# Altium footprint library MIcrocontrollers.PcbLib: 4 footprints
Each footprint in its own frame and in the unit in brackets; x right, y up, seen from the top. Pads: shape width x height; smd on the part's side, far side on the other; paste and mask are expansions set on the pad; w line width, h text height; cw(c..) or ccw(c..) is an arc to the next point about the centre after c.
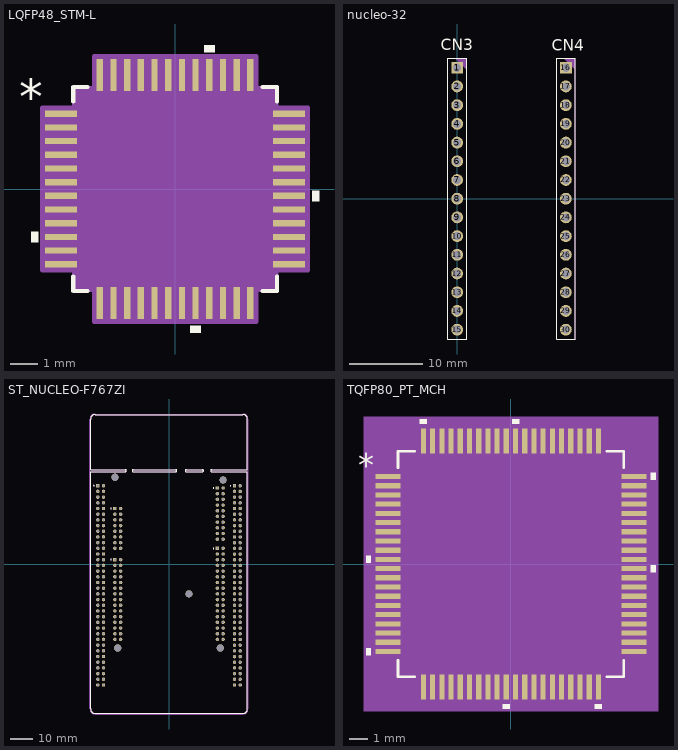
[diagram p0: the footprints below, top view; thin cyan lines are the x and y axes]

## LQFP48_STM-L [mil]
pads (48):
  rect 46x9 smd paste+0 mask+0: 1(-164,108.27) 2(-164,88.58) 3(-164,68.9) 4(-164,49.21) 5(-164,29.53) 6(-164,9.84) 7(-164,-9.84) 8(-164,-29.53) 9(-164,-49.21) 10(-164,-68.9) 11(-164,-88.58) 12(-164,-108.27) 25(164,-108.27) 26(164,-88.58) 27(164,-68.9) 28(164,-49.21) 29(164,-29.53) 30(164,-9.84) 31(164,9.84) 32(164,29.53) 33(164,49.21) 34(164,68.9) 35(164,88.58) 36(164,108.27)
  rect 9x46 smd paste+0 mask+0: 13(-108.27,-164) 14(-88.58,-164) 15(-68.9,-164) 16(-49.21,-164) 17(-29.53,-164) 18(-9.84,-164) 19(9.84,-164) 20(29.53,-164) 21(49.21,-164) 22(68.9,-164) 23(88.58,-164) 24(108.27,-164) 37(108.27,164) 38(88.58,164) 39(68.9,164) 40(49.21,164) 41(29.53,164) 42(9.84,164) 43(-9.84,164) 44(-29.53,164) 45(-49.21,164) 46(-68.9,164) 47(-88.58,164) 48(-108.27,164)
Top Overlay:
  region: 56.71,197 41.71,197 41.71,207 56.71,207
  region: 197,-2.34 207,-2.34 207,-17.34 197,-17.34
  region: 37.03,-197 22.03,-197 22.03,-207 37.03,-207
  region: -197,-61.4 -207,-61.4 -207,-76.4 -197,-76.4
  lines w6: -146.5,-125.87 -146.5,-146.5 -125.87,-146.5 ; -146.5,125.87 -146.5,146.5 -125.87,146.5 ; 125.87,-146.5 146.5,-146.5 146.5,-125.87 ; 125.87,146.5 146.5,146.5 146.5,125.87
  text "*" at -224.5,108.11 h50
Mechanical 13:
  drawing of 197 lines, arcs and shapes, not listed
  text "*" at -139,93.11 h50
Mechanical 15:
  region: -115.77,-145.5 -144.5,-145.5 -144.5,-116.77 -190,-116.77 -190,116.77 -144.5,116.77 -144.5,145.5 -115.77,145.5 -115.77,191 117.77,191 117.77,145.5 146.5,145.5 146.5,116.77 192,116.77 192,-116.77 146.5,-116.77 146.5,-145.5 117.77,-145.5 117.77,-191 -115.77,-191
  lines w6: -191,-116.77 -191,116.77 -145.5,116.77 -145.5,145.5 -116.77,145.5 -116.77,191 116.77,191 116.77,145.5 145.5,145.5 145.5,116.77 191,116.77 191,-116.77 145.5,-116.77 145.5,-145.5 116.77,-145.5 116.77,-191 -116.77,-191 -116.77,-145.5 -145.5,-145.5 -145.5,-116.77 -191,-116.77
3D body "LQFP48_STM.step": height 63.11, standoff 0, extent -180.98,-180.98 180.98,180.98

## nucleo-32 [mm]
pads (30):
  rect 1.6x1.6 hole 1.1: 1(0,17.78) 16(14.76,17.78)
  round 1.6 hole 1.1: 2(0,15.24) 3(0,12.7) 4(0,10.16) 5(0,7.62) 6(0,5.08) 7(0,2.54) 8(0,0) 9(0,-2.54) 10(0,-5.08) 11(0,-7.62) 12(0,-10.16) 13(0,-12.7) 14(0,-15.24) 15(0,-17.78) 17(14.76,15.24) 18(14.76,12.7) 19(14.76,10.16) 20(14.76,7.62) 21(14.76,5.08) 22(14.76,2.54) 23(14.76,0) 24(14.76,-2.54) 25(14.76,-5.08) 26(14.76,-7.62) 27(14.76,-10.16) 28(14.76,-12.7) 29(14.76,-15.24) 30(14.76,-17.78)
Top Overlay:
  lines w0.15: -1.27,-19.05 1.27,-19.05 1.27,19.05 -1.27,19.05 -1.27,-19.05 ; 13.49,-19.05 16.03,-19.05 16.03,19.05 13.49,19.05 13.49,-19.05
  text "CN4" at 12.866,20.115 h1.52
  text "CN3" at -2.224,20.158 h1.52
Mechanical 29:
  region: 16.03,19.05 16.03,17.526 14.506,19.05
  region: 1.27,19.05 1.27,17.526 -0.254,19.05
  lines w0.15: -1.27,-19.05 -1.27,19.05 1.27,19.05 1.27,-19.05 -1.27,-19.05 ; 13.49,-19.05 13.49,19.05 16.03,19.05 16.03,-19.05 13.49,-19.05
3D body "PLS-1.STEP": height 8.5, standoff -3, extent 13.49,-19.05 16.03,-16.51
3D body "PLS-1.STEP": height 8.5, standoff -3, extent 13.49,-16.51 16.03,-13.97
3D body "PLS-1.STEP": height 8.5, standoff -3, extent 13.49,-13.97 16.03,-11.43
3D body "PLS-1.STEP": height 8.5, standoff -3, extent 13.49,-11.43 16.03,-8.89
3D body "PLS-1.STEP": height 8.5, standoff -3, extent 13.49,-8.89 16.03,-6.35
3D body "PLS-1.STEP": height 8.5, standoff -3, extent 13.49,-6.35 16.03,-3.81
3D body "PLS-1.STEP": height 8.5, standoff -3, extent 13.49,-3.81 16.03,-1.27
3D body "PLS-1.STEP": height 8.5, standoff -3, extent 13.49,-1.27 16.03,1.27
3D body "PLS-1.STEP": height 8.5, standoff -3, extent 13.49,1.27 16.03,3.81
3D body "PLS-1.STEP": height 8.5, standoff -3, extent 13.49,3.81 16.03,6.35
3D body "PLS-1.STEP": height 8.5, standoff -3, extent 13.49,6.35 16.03,8.89
3D body "PLS-1.STEP": height 8.5, standoff -3, extent 13.49,8.89 16.03,11.43
3D body "PLS-1.STEP": height 8.5, standoff -3, extent 13.49,11.43 16.03,13.97
3D body "PLS-1.STEP": height 8.5, standoff -3, extent 13.49,13.97 16.03,16.51
3D body "PLS-1.STEP": height 8.5, standoff -3, extent 13.49,16.51 16.03,19.05
3D body "PLS-1.STEP": height 8.5, standoff -3, extent -1.27,-19.05 1.27,-16.51
3D body "PLS-1.STEP": height 8.5, standoff -3, extent -1.27,-16.51 1.27,-13.97
3D body "PLS-1.STEP": height 8.5, standoff -3, extent -1.27,-13.97 1.27,-11.43
3D body "PLS-1.STEP": height 8.5, standoff -3, extent -1.27,-11.43 1.27,-8.89
3D body "PLS-1.STEP": height 8.5, standoff -3, extent -1.27,-8.89 1.27,-6.35
3D body "PLS-1.STEP": height 8.5, standoff -3, extent -1.27,-6.35 1.27,-3.81
3D body "PLS-1.STEP": height 8.5, standoff -3, extent -1.27,-3.81 1.27,-1.27
3D body "PLS-1.STEP": height 8.5, standoff -3, extent -1.27,-1.27 1.27,1.27
3D body "PLS-1.STEP": height 8.5, standoff -3, extent -1.27,1.27 1.27,3.81
3D body "PLS-1.STEP": height 8.5, standoff -3, extent -1.27,3.81 1.27,6.35
3D body "PLS-1.STEP": height 8.5, standoff -3, extent -1.27,6.35 1.27,8.89
3D body "PLS-1.STEP": height 8.5, standoff -3, extent -1.27,8.89 1.27,11.43
3D body "PLS-1.STEP": height 8.5, standoff -3, extent -1.27,11.43 1.27,13.97
3D body "PLS-1.STEP": height 8.5, standoff -3, extent -1.27,13.97 1.27,16.51
3D body "PLS-1.STEP": height 8.5, standoff -3, extent -1.27,16.51 1.27,19.05

## ST_NUCLEO-F767ZI [mm]
pads (249):
  rect 1.53x1.53 / inner round 1.53 / far side rect 1.53x1.53 hole 1.02: CN7_1(21.59,33.914) CN8_1(-24.13,24.77) CN9_1(-24.13,1.91) CN10_1(21.59,6.99) CN11_1(-31.75,34.93) CN12_1(29.21,34.91)
  round 1.53 hole 1.02: CN7_2(24.13,33.914) CN7_3(21.59,31.374) CN7_4(24.13,31.374) CN7_5(21.59,28.834) CN7_6(24.13,28.834) CN7_7(21.59,26.294) CN7_8(24.13,26.294) CN7_9(21.59,23.754) CN7_10(24.13,23.754) CN7_11(21.59,21.214) CN7_12(24.13,21.214) CN7_13(21.59,18.674) CN7_14(24.13,18.674) CN7_15(21.59,16.134) CN7_16(24.13,16.134) CN7_17(21.59,13.594) CN7_18(24.13,13.594) CN7_19(21.59,11.054) CN7_20(24.13,11.054) CN8_2(-21.59,24.77) CN8_3(-24.13,22.23) CN8_4(-21.59,22.23) CN8_5(-24.13,19.69) CN8_6(-21.59,19.69) CN8_7(-24.13,17.15) CN8_8(-21.59,17.15) CN8_9(-24.13,14.61) CN8_10(-21.59,14.61) CN8_11(-24.13,12.07) CN8_12(-21.59,12.07) CN8_13(-24.13,9.53) CN8_14(-21.59,9.53) CN8_15(-24.13,6.99) CN8_16(-21.59,6.99) CN9_2(-21.59,1.91) CN9_3(-24.13,-0.63) CN9_4(-21.59,-0.63) CN9_5(-24.13,-3.17) CN9_6(-21.59,-3.17) CN9_7(-24.13,-5.71) CN9_8(-21.59,-5.71) CN9_9(-24.13,-8.25) CN9_10(-21.59,-8.25) CN9_11(-24.13,-10.79) CN9_12(-21.59,-10.79) CN9_13(-24.13,-13.33) CN9_14(-21.59,-13.33) CN9_15(-24.13,-15.87) CN9_16(-21.59,-15.87) CN9_17(-24.13,-18.41) CN9_18(-21.59,-18.41) CN9_19(-24.13,-20.95) CN9_20(-21.59,-20.95) CN9_21(-24.13,-23.49) CN9_22(-21.59,-23.49) CN9_23(-24.13,-26.03) CN9_24(-21.59,-26.03) CN9_25(-24.13,-28.57) CN9_26(-21.59,-28.57) CN9_27(-24.13,-31.11) CN9_28(-21.59,-31.11) CN9_29(-24.13,-33.65) CN9_30(-21.59,-33.65) CN10_2(24.13,6.99) CN10_3(21.59,4.45) CN10_4(24.13,4.45) CN10_5(21.59,1.91) CN10_6(24.13,1.91) CN10_7(21.59,-0.63) CN10_8(24.13,-0.63) CN10_9(21.59,-3.17) CN10_10(24.13,-3.17) CN10_11(21.59,-5.71) CN10_12(24.13,-5.71) CN10_13(21.59,-8.25) CN10_14(24.13,-8.25) CN10_15(21.59,-10.79) CN10_16(24.13,-10.79) CN10_17(21.59,-13.33) CN10_18(24.13,-13.33) CN10_19(21.59,-15.87) CN10_20(24.13,-15.87) CN10_21(21.59,-18.41) CN10_22(24.13,-18.41) CN10_23(21.59,-20.95) CN10_24(24.13,-20.95) CN10_25(21.59,-23.49) CN10_26(24.13,-23.49) CN10_27(21.59,-26.03) CN10_28(24.13,-26.03) CN10_29(21.59,-28.57) CN10_30(24.13,-28.57) CN10_31(21.59,-31.11) CN10_32(24.13,-31.11) CN10_33(21.59,-33.65) CN10_34(24.13,-33.65) CN11_2(-29.21,34.93) CN11_3(-31.75,32.39) CN11_4(-29.21,32.39) CN11_5(-31.75,29.85) CN11_6(-29.21,29.85) CN11_7(-31.75,27.31) CN11_8(-29.21,27.31) CN11_9(-31.75,24.77) CN11_10(-29.21,24.77) CN11_11(-31.75,22.23) CN11_12(-29.21,22.23) CN11_13(-31.75,19.69) CN11_14(-29.21,19.69) CN11_15(-31.75,17.15) CN11_16(-29.21,17.15) CN11_17(-31.75,14.61) CN11_18(-29.21,14.61) CN11_19(-31.75,12.07) CN11_20(-29.21,12.07) CN11_21(-31.75,9.53) CN11_22(-29.21,9.53) CN11_23(-31.75,6.99) CN11_24(-29.21,6.99) CN11_25(-31.75,4.45) CN11_26(-29.21,4.45) CN11_27(-31.75,1.91) CN11_28(-29.21,1.91) CN11_29(-31.75,-0.63) CN11_30(-29.21,-0.63) CN11_31(-31.75,-3.17) CN11_32(-29.21,-3.17) CN11_33(-31.75,-5.71) CN11_34(-29.21,-5.71) CN11_35(-31.75,-8.25) CN11_36(-29.21,-8.25) CN11_37(-31.75,-10.79) CN11_38(-29.21,-10.79) CN11_39(-31.75,-13.33) CN11_40(-29.21,-13.33) CN11_41(-31.75,-15.87) CN11_42(-29.21,-15.87) CN11_43(-31.75,-18.41) CN11_44(-29.21,-18.41) CN11_45(-31.75,-20.95) CN11_46(-29.21,-20.95) CN11_47(-31.75,-23.49) CN11_48(-29.21,-23.49) CN11_49(-31.75,-26.03) CN11_50(-29.21,-26.03) CN11_51(-31.75,-28.57) CN11_52(-29.21,-28.57) CN11_53(-31.75,-31.11) CN11_54(-29.21,-31.11) CN11_55(-31.75,-33.65) CN11_56(-29.21,-33.65) CN11_57(-31.75,-36.19) CN11_58(-29.21,-36.19) CN11_59(-31.75,-38.73) CN11_60(-29.21,-38.73) CN11_61(-31.75,-41.27) CN11_62(-29.21,-41.27) CN11_63(-31.75,-43.81) CN11_64(-29.21,-43.81) CN11_65(-31.75,-46.35) CN11_66(-29.21,-46.35) CN11_67(-31.75,-48.89) CN11_68(-29.21,-48.89) CN11_69(-31.75,-51.43) CN11_70(-29.21,-51.43) CN11_71(-31.75,-53.97) CN11_72(-29.21,-53.97) CN12_2(31.75,34.91) CN12_3(29.21,32.37) CN12_4(31.75,32.37) CN12_5(29.21,29.83) CN12_6(31.75,29.83) CN12_7(29.21,27.29) CN12_8(31.75,27.29) CN12_9(29.21,24.75) CN12_10(31.75,24.75) CN12_11(29.21,22.21) CN12_12(31.75,22.21) CN12_13(29.21,19.67) CN12_14(31.75,19.67) CN12_15(29.21,17.13) CN12_16(31.75,17.13) CN12_17(29.21,14.59) CN12_18(31.75,14.59) CN12_19(29.21,12.05) CN12_20(31.75,12.05) CN12_21(29.21,9.51) CN12_22(31.75,9.51) CN12_23(29.21,6.97) CN12_24(31.75,6.97) CN12_25(29.21,4.43) CN12_26(31.75,4.43) CN12_27(29.21,1.89) CN12_28(31.75,1.89) CN12_29(29.21,-0.65) CN12_30(31.75,-0.65) CN12_31(29.21,-3.19) CN12_32(31.75,-3.19) CN12_33(29.21,-5.73) CN12_34(31.75,-5.73) CN12_35(29.21,-8.27) CN12_36(31.75,-8.27) CN12_37(29.21,-10.81) CN12_38(31.75,-10.81) CN12_39(29.21,-13.35) CN12_40(31.75,-13.35) CN12_41(29.21,-15.89) CN12_42(31.75,-15.89) CN12_43(29.21,-18.43) CN12_44(31.75,-18.43) CN12_45(29.21,-20.97) CN12_46(31.75,-20.97) CN12_47(29.21,-23.51) CN12_48(31.75,-23.51) CN12_49(29.21,-26.05) CN12_50(31.75,-26.05) CN12_51(29.21,-28.59) CN12_52(31.75,-28.59) CN12_53(29.21,-31.13) CN12_54(31.75,-31.13) CN12_55(29.21,-33.67) CN12_56(31.75,-33.67) CN12_57(29.21,-36.21) CN12_58(31.75,-36.21) CN12_59(29.21,-38.75) CN12_60(31.75,-38.75) CN12_61(29.21,-41.29) CN12_62(31.75,-41.29) CN12_63(29.21,-43.83) CN12_64(31.75,-43.83) CN12_65(29.21,-46.37) CN12_66(31.75,-46.37) CN12_67(29.21,-48.91) CN12_68(31.75,-48.91) CN12_69(29.21,-51.45) CN12_70(31.75,-51.45) CN12_71(29.21,-53.99) CN12_72(31.75,-53.99)
  round 3.2 hole 3.2 unplated: ""(-24.13,38.74) ""(-22.86,-37.46) ""(8.89,-13.33) ""(22.86,-37.46) ""(24.13,37.47)
Top Overlay:
  circle w0.2: c-33.5,34.93 r0.1
  circle w0.2: c27.46,34.905 r0.1
  circle w0.2: c-25.88,24.77 r0.1
  circle w0.2: c-25.88,1.91 r0.1
  circle w0.2: c19.84,33.914 r0.1
  circle w0.2: c19.84,6.99 r0.1
  lines w0.127: -19.507,41.17 -35,41.17 -35,-64.67 ccw(c-33,-64.67) -33,-66.67 33,-66.67 ccw(c33,-64.67) 35,-64.67 35,41.17 18.999,41.17 ; -19.507,42.11 -35,42.11 -35,64.67 cw(c-33,64.67) -33,66.67 33,66.67 cw(c33,64.67) 35,64.67 35,42.11 18.999,42.11 ; -19.506,41.17 ccw(c-19.515,41.64) -19.506,42.11 ; -16.003,41.17 cw(c-15.995,41.64) -16.003,42.11 ; -16.002,41.17 2.997,41.17 ; -16.002,42.11 2.997,42.11 ; 2.998,41.17 ccw(c2.99,41.64) 2.998,42.11 ; 7.619,41.17 cw(c7.627,41.64) 7.619,42.11 ; 7.62,41.17 14.935,41.17 ; 7.62,42.11 14.935,42.11 ; 14.936,41.17 ccw(c14.928,41.64) 14.936,42.11 ; 18.998,41.17 cw(c19.007,41.64) 18.998,42.11
Mechanical 13:
  circle w0.2: c-33.5,34.93 r0.1
  circle w0.2: c27.46,34.905 r0.1
  circle w0.2: c-25.88,24.77 r0.1
  circle w0.2: c-25.88,1.91 r0.1
  circle w0.2: c19.84,33.914 r0.1
  circle w0.2: c19.84,6.99 r0.1
  lines w0.127: -19.507,41.17 -35,41.17 -35,-64.67 ccw(c-33,-64.67) -33,-66.67 33,-66.67 ccw(c33,-64.67) 35,-64.67 35,41.17 18.999,41.17 ; -19.507,42.11 -35,42.11 -35,64.67 cw(c-33,64.67) -33,66.67 33,66.67 cw(c33,64.67) 35,64.67 35,42.11 18.999,42.11 ; -19.506,41.17 ccw(c-19.515,41.64) -19.506,42.11 ; -16.003,41.17 cw(c-15.995,41.64) -16.003,42.11 ; -16.002,41.17 2.997,41.17 ; -16.002,42.11 2.997,42.11 ; 2.998,41.17 ccw(c2.99,41.64) 2.998,42.11 ; 7.619,41.17 cw(c7.627,41.64) 7.619,42.11 ; 7.62,41.17 14.935,41.17 ; 7.62,42.11 14.935,42.11 ; 14.936,41.17 ccw(c14.928,41.64) 14.936,42.11 ; 18.998,41.17 cw(c19.007,41.64) 18.998,42.11
Mechanical 15:
  lines w0.05: -35.25,-64.67 ccw(c-33,-64.67) -33,-66.92 33,-66.92 ccw(c33,-64.67) 35.25,-64.67 35.25,64.67 ccw(c33,64.67) 33,66.92 -33,66.92 ccw(c-33,64.67) -35.25,64.67 -35.25,-64.67
3D body "NUCLEO-F767ZI--3DModel-STEP-56544.STEP": height 12.28, standoff -8.54, extent -35,-69.27 35,67.72

## TQFP80_PT_MCH [mil]
pads (80):
  rect 53.28x11 smd paste+0 mask+0: 1(-262.64,187.01) 2(-262.64,167.32) 3(-262.64,147.64) 4(-262.64,127.95) 5(-262.64,108.27) 6(-262.64,88.58) 7(-262.64,68.9) 8(-262.64,49.21) 9(-262.64,29.53) 10(-262.64,9.84) 11(-262.64,-9.84) 12(-262.64,-29.53) 13(-262.64,-49.21) 14(-262.64,-68.9) 15(-262.64,-88.58) 16(-262.64,-108.27) 17(-262.64,-127.95) 18(-262.64,-147.64) 19(-262.64,-167.32) 20(-262.64,-187.01) 41(262.64,-187.01) 42(262.64,-167.32) 43(262.64,-147.64) 44(262.64,-127.95) 45(262.64,-108.27) 46(262.64,-88.58) 47(262.64,-68.9) 48(262.64,-49.21) 49(262.64,-29.53) 50(262.64,-9.84) 51(262.64,9.84) 52(262.64,29.53) 53(262.64,49.21) 54(262.64,68.9) 55(262.64,88.58) 56(262.64,108.27) 57(262.64,127.95) 58(262.64,147.64) 59(262.64,167.32) 60(262.64,187.01)
  rect 11x53.28 smd paste+0 mask+0: 21(-187.01,-262.64) 22(-167.32,-262.64) 23(-147.64,-262.64) 24(-127.95,-262.64) 25(-108.27,-262.64) 26(-88.58,-262.64) 27(-68.9,-262.64) 28(-49.21,-262.64) 29(-29.53,-262.64) 30(-9.84,-262.64) 31(9.84,-262.64) 32(29.53,-262.64) 33(49.21,-262.64) 34(68.9,-262.64) 35(88.58,-262.64) 36(108.27,-262.64) 37(127.95,-262.64) 38(147.64,-262.64) 39(167.32,-262.64) 40(187.01,-262.64) 61(187.01,262.64) 62(167.32,262.64) 63(147.64,262.64) 64(127.95,262.64) 65(108.27,262.64) 66(88.58,262.64) 67(68.9,262.64) 68(49.21,262.64) 69(29.53,262.64) 70(9.84,262.64) 71(-9.84,262.64) 72(-29.53,262.64) 73(-49.21,262.64) 74(-68.9,262.64) 75(-88.58,262.64) 76(-108.27,262.64) 77(-127.95,262.64) 78(-147.64,262.64) 79(-167.32,262.64) 80(-187.01,262.64)
Top Overlay:
  region: -179.51,299.28 -194.51,299.28 -194.51,309.28 -179.51,309.28
  region: 17.34,299.28 2.34,299.28 2.34,309.28 17.34,309.28
  region: 299.28,194.51 309.28,194.51 309.28,179.51 299.28,179.51
  region: 299.28,-2.34 309.28,-2.34 309.28,-17.34 299.28,-17.34
  region: 194.51,-299.28 179.51,-299.28 179.51,-309.28 194.51,-309.28
  region: -2.34,-299.28 -17.34,-299.28 -17.34,-309.28 -2.34,-309.28
  region: -299.28,-179.51 -309.28,-179.51 -309.28,-194.51 -299.28,-194.51
  region: -299.28,17.34 -309.28,17.34 -309.28,2.34 -299.28,2.34
  lines w6: -241,-205.61 -241,-241 -205.61,-241 ; -241,205.61 -241,241 -205.61,241 ; 205.61,-241 241,-241 241,-205.61 ; 205.61,241 241,241 241,205.61
  text "*" at -326.78,186.85 h50
Bottom 3D Body:
  region: 314.28,-314.28 -314.28,-314.28 -314.28,314.28 314.28,314.28
Mechanical 13:
  drawing of 325 lines, arcs and shapes, not listed
  text "*" at -233.5,171.85 h50
Mechanical 15:
  region: -202.51,-246 -246,-246 -246,-202.51 -299.28,-202.51 -299.28,202.51 -246,202.51 -246,246 -202.51,246 -202.51,299.28 202.51,299.28 202.51,246 246,246 246,202.51 299.28,202.51 299.28,-202.51 246,-202.51 246,-246 202.51,-246 202.51,-299.28 -202.51,-299.28
  lines w6: -299.28,-202.51 -299.28,202.51 -246,202.51 -246,246 -202.51,246 -202.51,299.28 202.51,299.28 202.51,246 246,246 246,202.51 299.28,202.51 299.28,-202.51 246,-202.51 246,-246 202.51,-246 202.51,-299.28 -202.51,-299.28 -202.51,-246 -246,-246 -246,-202.51 -299.28,-202.51
3D body "TQFP80_PT_MCH.step": height 47.09, standoff 0, extent -275.51,-275.51 275.51,275.51